# Altium schematic symbol library jlcpcb_2025_04_capacitors_extended_1206.schlib: 2503 symbols (part 13 of 14) (continued)
## TCC1206X7R104K251FTS
designator C?  Capacitance: 100nF  (hidden comment: *)
Capacitor, Ceramic (MLCC), 100nF, ±10%, 250V, X7R, ±10%, SMD 1206; Manufacturer: CCTC; Manufacturer Part Number: TCC1206X7R104K251FTS; Package Size: 1206; JLCPCB Basic Part: No; JLCPCB Part Number: C374076; Supplier 1: LCSC; Category: Capacitors - MLCC; Supplier Part Number 1: C374076; Tolerance: ±10%; Voltage Rating: 250V; Temperature Coefficient: X7R; RoHS: Yes; ComponentLink1Description: Datasheet; ComponentLink1URL: https://wmsc.lcsc.com/wmsc/upload/file/pdf/v2/lcsc/2304140030_CCTC-TCC1206X7R104K251FTS_C374076.pdf; ComponentLink2Description: JLCPCB Part URL; ComponentLink2URL: https://jlcpcb.com/partdetail/C374076; ComponentLink3Description: LCSC Part URL; ComponentLink3URL: https://lcsc.com/product-detail/Multilayer-Ceramic-Capacitors-MLCC---SMD-SMT_CCTC-CCTC-TCC1206X7R104K251FTS_C374076.html
footprint CAP-1206 (1206 (3216M) Capacitor)
pins: 1, 2

## TCC1206X7R104K251HT
designator C?  Capacitance: 100nF  (hidden comment: *)
Capacitor, Ceramic (MLCC), 100nF, ±10%, 250V, X7R, ±10%, SMD 1206; Manufacturer: CCTC; Manufacturer Part Number: TCC1206X7R104K251HT; Package Size: 1206; JLCPCB Basic Part: No; JLCPCB Part Number: C377065; Supplier 1: LCSC; Category: Capacitors - MLCC; Supplier Part Number 1: C377065; Tolerance: ±10%; Voltage Rating: 250V; Temperature Coefficient: X7R; RoHS: Yes; ComponentLink1Description: Datasheet; ComponentLink1URL: https://wmsc.lcsc.com/wmsc/upload/file/pdf/v2/lcsc/2304140030_CCTC-TCC1206X7R104K251HT_C377065.pdf; ComponentLink2Description: JLCPCB Part URL; ComponentLink2URL: https://jlcpcb.com/partdetail/C377065; ComponentLink3Description: LCSC Part URL; ComponentLink3URL: https://lcsc.com/product-detail/Multilayer-Ceramic-Capacitors-MLCC---SMD-SMT_CCTC-CCTC-TCC1206X7R104K251HT_C377065.html
footprint CAP-1206 (1206 (3216M) Capacitor)
pins: 1, 2

## TCC1206X7R104K451HT
designator C?  Capacitance: 100nF  (hidden comment: *)
Capacitor, Ceramic (MLCC), 100nF, ±10%, 450V, X7R, ±10%, SMD 1206; Manufacturer: CCTC; Manufacturer Part Number: TCC1206X7R104K451HT; Package Size: 1206; JLCPCB Basic Part: No; JLCPCB Part Number: C359183; Supplier 1: LCSC; Category: Capacitors - MLCC; Supplier Part Number 1: C359183; Tolerance: ±10%; Voltage Rating: 450V; Temperature Coefficient: X7R; RoHS: Yes; ComponentLink1Description: Datasheet; ComponentLink1URL: https://wmsc.lcsc.com/wmsc/upload/file/pdf/v2/lcsc/2312281452_CCTC-TCC1206X7R104K451HT_C359183.pdf; ComponentLink2Description: JLCPCB Part URL; ComponentLink2URL: https://jlcpcb.com/partdetail/C359183; ComponentLink3Description: LCSC Part URL; ComponentLink3URL: https://lcsc.com/product-detail/Multilayer-Ceramic-Capacitors-MLCC---SMD-SMT_CCTC-CCTC-TCC1206X7R104K451HT_C359183.html
footprint CAP-1206 (1206 (3216M) Capacitor)
pins: 1, 2

## TCC1206X7R104K500DT
designator C?  Capacitance: 100nF  (hidden comment: *)
Capacitor, Ceramic (MLCC), 100nF, ±10%, 50V, X7R, ±10%, SMD 1206; Manufacturer: CCTC; Manufacturer Part Number: TCC1206X7R104K500DT; Package Size: 1206; JLCPCB Basic Part: No; JLCPCB Part Number: C309030; Supplier 1: LCSC; Category: Capacitors - MLCC; Supplier Part Number 1: C309030; Tolerance: ±10%; Voltage Rating: 50V; Temperature Coefficient: X7R; RoHS: Yes; ComponentLink1Description: Datasheet; ComponentLink1URL: https://wmsc.lcsc.com/wmsc/upload/file/pdf/v2/lcsc/2304140030_CCTC-TCC1206X7R104K500DT_C309030.pdf; ComponentLink2Description: JLCPCB Part URL; ComponentLink2URL: https://jlcpcb.com/partdetail/C309030; ComponentLink3Description: LCSC Part URL; ComponentLink3URL: https://lcsc.com/product-detail/Multilayer-Ceramic-Capacitors-MLCC---SMD-SMT_CCTC-CCTC-TCC1206X7R104K500DT_C309030.html
footprint CAP-1206 (1206 (3216M) Capacitor)
pins: 1, 2

## TCC1206X7R104K500DTS
designator C?  Capacitance: 100nF  (hidden comment: *)
Capacitor, Ceramic (MLCC), 100nF, ±10%, 50V, X7R, ±10%, SMD 1206; Manufacturer: CCTC; Manufacturer Part Number: TCC1206X7R104K500DTS; Package Size: 1206; JLCPCB Basic Part: No; JLCPCB Part Number: C377066; Supplier 1: LCSC; Category: Capacitors - MLCC; Supplier Part Number 1: C377066; Tolerance: ±10%; Voltage Rating: 50V; Temperature Coefficient: X7R; RoHS: Yes; ComponentLink1Description: Datasheet; ComponentLink1URL: https://wmsc.lcsc.com/wmsc/upload/file/pdf/v2/lcsc/2304140030_CCTC-TCC1206X7R104K500DTS_C377066.pdf; ComponentLink2Description: JLCPCB Part URL; ComponentLink2URL: https://jlcpcb.com/partdetail/C377066; ComponentLink3Description: LCSC Part URL; ComponentLink3URL: https://lcsc.com/product-detail/Multilayer-Ceramic-Capacitors-MLCC---SMD-SMT_CCTC-CCTC-TCC1206X7R104K500DTS_C377066.html
footprint CAP-1206 (1206 (3216M) Capacitor)
pins: 1, 2

## TCC1206X7R104M251FT
designator C?  Capacitance: 100nF  (hidden comment: *)
Capacitor, Ceramic (MLCC), 100nF, ±20%, 250V, X7R, ±20%, SMD 1206; Manufacturer: CCTC; Manufacturer Part Number: TCC1206X7R104M251FT; Package Size: 1206; JLCPCB Basic Part: No; JLCPCB Part Number: C282822; Supplier 1: LCSC; Category: Capacitors - MLCC; Supplier Part Number 1: C282822; Tolerance: ±20%; Voltage Rating: 250V; Temperature Coefficient: X7R; RoHS: Yes; ComponentLink1Description: Datasheet; ComponentLink1URL: https://wmsc.lcsc.com/wmsc/upload/file/pdf/v2/lcsc/2304140030_CCTC-TCC1206X7R104M251FT_C282822.pdf; ComponentLink2Description: JLCPCB Part URL; ComponentLink2URL: https://jlcpcb.com/partdetail/C282822; ComponentLink3Description: LCSC Part URL; ComponentLink3URL: https://lcsc.com/product-detail/Multilayer-Ceramic-Capacitors-MLCC---SMD-SMT_CCTC-CCTC-TCC1206X7R104M251FT_C282822.html
footprint CAP-1206 (1206 (3216M) Capacitor)
pins: 1, 2

## TCC1206X7R104M500DT
designator C?  Capacitance: 100nF  (hidden comment: *)
Capacitor, Ceramic (MLCC), 100nF, ±20%, 50V, X7R, ±20%, SMD 1206; Manufacturer: CCTC; Manufacturer Part Number: TCC1206X7R104M500DT; Package Size: 1206; JLCPCB Basic Part: No; JLCPCB Part Number: C377067; Supplier 1: LCSC; Category: Capacitors - MLCC; Supplier Part Number 1: C377067; Tolerance: ±20%; Voltage Rating: 50V; Temperature Coefficient: X7R; RoHS: Yes; ComponentLink1Description: Datasheet; ComponentLink1URL: https://wmsc.lcsc.com/wmsc/upload/file/pdf/v2/lcsc/2304140030_CCTC-TCC1206X7R104M500DT_C377067.pdf; ComponentLink2Description: JLCPCB Part URL; ComponentLink2URL: https://jlcpcb.com/partdetail/C377067; ComponentLink3Description: LCSC Part URL; ComponentLink3URL: https://lcsc.com/product-detail/Multilayer-Ceramic-Capacitors-MLCC---SMD-SMT_CCTC-CCTC-TCC1206X7R104M500DT_C377067.html
footprint CAP-1206 (1206 (3216M) Capacitor)
pins: 1, 2

## TCC1206X7R104M501HT
designator C?  Capacitance: 100nF  (hidden comment: *)
Capacitor, Ceramic (MLCC), 100nF, ±20%, 500V, X7R, ±20%, SMD 1206; Manufacturer: CCTC; Manufacturer Part Number: TCC1206X7R104M501HT; Package Size: 1206; JLCPCB Basic Part: No; JLCPCB Part Number: C5448952; Supplier 1: LCSC; Category: Capacitors - MLCC; Supplier Part Number 1: C5448952; Tolerance: ±20%; Voltage Rating: 500V; Temperature Coefficient: X7R; RoHS: Yes; ComponentLink1Description: Datasheet; ComponentLink2Description: JLCPCB Part URL; ComponentLink2URL: https://jlcpcb.com/partdetail/C5448952; ComponentLink3Description: LCSC Part URL; ComponentLink3URL: https://lcsc.com/product-detail/Multilayer-Ceramic-Capacitors-MLCC---SMD-SMT_CCTC-CCTC-TCC1206X7R104M501HT_C5448952.html
footprint CAP-1206 (1206 (3216M) Capacitor)
pins: 1, 2

## TCC1206X7R105K101HT
designator C?  Capacitance: 1uF  (hidden comment: *)
Capacitor, Ceramic (MLCC), 1uF, ±10%, 100V, X7R, ±10%, SMD 1206; Manufacturer: CCTC; Manufacturer Part Number: TCC1206X7R105K101HT; Package Size: 1206; JLCPCB Basic Part: No; JLCPCB Part Number: C282823; Supplier 1: LCSC; Category: Capacitors - MLCC; Supplier Part Number 1: C282823; Tolerance: ±10%; Voltage Rating: 100V; Temperature Coefficient: X7R; RoHS: Yes; ComponentLink1Description: Datasheet; ComponentLink1URL: https://wmsc.lcsc.com/wmsc/upload/file/pdf/v2/lcsc/2211221000_CCTC-TCC1206X7R105K101HT_C282823.pdf; ComponentLink2Description: JLCPCB Part URL; ComponentLink2URL: https://jlcpcb.com/partdetail/C282823; ComponentLink3Description: LCSC Part URL; ComponentLink3URL: https://lcsc.com/product-detail/Multilayer-Ceramic-Capacitors-MLCC---SMD-SMT_CCTC-CCTC-TCC1206X7R105K101HT_C282823.html
footprint CAP-1206 (1206 (3216M) Capacitor)
pins: 1, 2

## TCC1206X7R105K500HT
designator C?  Capacitance: 1uF  (hidden comment: *)
Capacitor, Ceramic (MLCC), 1uF, ±10%, 50V, X7R, ±10%, SMD 1206; Manufacturer: CCTC; Manufacturer Part Number: TCC1206X7R105K500HT; Package Size: 1206; JLCPCB Basic Part: No; JLCPCB Part Number: C282824; Supplier 1: LCSC; Category: Capacitors - MLCC; Supplier Part Number 1: C282824; Tolerance: ±10%; Voltage Rating: 50V; Temperature Coefficient: X7R; RoHS: Yes; ComponentLink1Description: Datasheet; ComponentLink1URL: https://wmsc.lcsc.com/wmsc/upload/file/pdf/v2/lcsc/2304140030_CCTC-TCC1206X7R105K500HT_C282824.pdf; ComponentLink2Description: JLCPCB Part URL; ComponentLink2URL: https://jlcpcb.com/partdetail/C282824; ComponentLink3Description: LCSC Part URL; ComponentLink3URL: https://lcsc.com/product-detail/Multilayer-Ceramic-Capacitors-MLCC---SMD-SMT_CCTC-CCTC-TCC1206X7R105K500HT_C282824.html
footprint CAP-1206 (1206 (3216M) Capacitor)
pins: 1, 2

## TCC1206X7R105M101HT
designator C?  Capacitance: 1uF  (hidden comment: *)
Capacitor, Ceramic (MLCC), 1uF, ±20%, 100V, X7R, ±20%, SMD 1206; Manufacturer: CCTC; Manufacturer Part Number: TCC1206X7R105M101HT; Package Size: 1206; JLCPCB Basic Part: No; JLCPCB Part Number: C282825; Supplier 1: LCSC; Category: Capacitors - MLCC; Supplier Part Number 1: C282825; Tolerance: ±20%; Voltage Rating: 100V; Temperature Coefficient: X7R; RoHS: Yes; ComponentLink1Description: Datasheet; ComponentLink1URL: https://wmsc.lcsc.com/wmsc/upload/file/pdf/v2/lcsc/2304140030_CCTC-TCC1206X7R105M101HT_C282825.pdf; ComponentLink2Description: JLCPCB Part URL; ComponentLink2URL: https://jlcpcb.com/partdetail/C282825; ComponentLink3Description: LCSC Part URL; ComponentLink3URL: https://lcsc.com/product-detail/Multilayer-Ceramic-Capacitors-MLCC---SMD-SMT_CCTC-CCTC-TCC1206X7R105M101HT_C282825.html
footprint CAP-1206 (1206 (3216M) Capacitor)
pins: 1, 2

## TCC1206X7R105M500HT
designator C?  Capacitance: 1uF  (hidden comment: *)
Capacitor, Ceramic (MLCC), 1uF, ±20%, 50V, X7R, ±20%, SMD 1206; Manufacturer: CCTC; Manufacturer Part Number: TCC1206X7R105M500HT; Package Size: 1206; JLCPCB Basic Part: No; JLCPCB Part Number: C377070; Supplier 1: LCSC; Category: Capacitors - MLCC; Supplier Part Number 1: C377070; Tolerance: ±20%; Voltage Rating: 50V; Temperature Coefficient: X7R; RoHS: Yes; ComponentLink1Description: Datasheet; ComponentLink1URL: https://wmsc.lcsc.com/wmsc/upload/file/pdf/v2/lcsc/2304140030_CCTC-TCC1206X7R105M500HT_C377070.pdf; ComponentLink2Description: JLCPCB Part URL; ComponentLink2URL: https://jlcpcb.com/partdetail/C377070; ComponentLink3Description: LCSC Part URL; ComponentLink3URL: https://lcsc.com/product-detail/Multilayer-Ceramic-Capacitors-MLCC---SMD-SMT_CCTC-CCTC-TCC1206X7R105M500HT_C377070.html
footprint CAP-1206 (1206 (3216M) Capacitor)
pins: 1, 2

## TCC1206X7R106K100HT
designator C?  Capacitance: 10uF  (hidden comment: *)
Capacitor, Ceramic (MLCC), 10uF, ±10%, 10V, X7R, ±10%, SMD 1206; Manufacturer: CCTC; Manufacturer Part Number: TCC1206X7R106K100HT; Package Size: 1206; JLCPCB Basic Part: No; JLCPCB Part Number: C380362; Supplier 1: LCSC; Category: Capacitors - MLCC; Supplier Part Number 1: C380362; Tolerance: ±10%; Voltage Rating: 10V; Temperature Coefficient: X7R; RoHS: Yes; ComponentLink1Description: Datasheet; ComponentLink1URL: https://wmsc.lcsc.com/wmsc/upload/file/pdf/v2/lcsc/2304140030_CCTC-TCC1206X7R106K100HT_C380362.pdf; ComponentLink2Description: JLCPCB Part URL; ComponentLink2URL: https://jlcpcb.com/partdetail/C380362; ComponentLink3Description: LCSC Part URL; ComponentLink3URL: https://lcsc.com/product-detail/Multilayer-Ceramic-Capacitors-MLCC---SMD-SMT_CCTC-CCTC-TCC1206X7R106K100HT_C380362.html
footprint CAP-1206 (1206 (3216M) Capacitor)
pins: 1, 2

## TCC1206X7R106K160HT
designator C?  Capacitance: 10uF  (hidden comment: *)
Capacitor, Ceramic (MLCC), 10uF, ±10%, 16V, X7R, ±10%, SMD 1206; Manufacturer: CCTC; Manufacturer Part Number: TCC1206X7R106K160HT; Package Size: 1206; JLCPCB Basic Part: No; JLCPCB Part Number: C380363; Supplier 1: LCSC; Category: Capacitors - MLCC; Supplier Part Number 1: C380363; Tolerance: ±10%; Voltage Rating: 16V; Temperature Coefficient: X7R; RoHS: Yes; ComponentLink1Description: Datasheet; ComponentLink1URL: https://wmsc.lcsc.com/wmsc/upload/file/pdf/v2/lcsc/2304140030_CCTC-TCC1206X7R106K160HT_C380363.pdf; ComponentLink2Description: JLCPCB Part URL; ComponentLink2URL: https://jlcpcb.com/partdetail/C380363; ComponentLink3Description: LCSC Part URL; ComponentLink3URL: https://lcsc.com/product-detail/Multilayer-Ceramic-Capacitors-MLCC---SMD-SMT_CCTC-CCTC-TCC1206X7R106K160HT_C380363.html
footprint CAP-1206 (1206 (3216M) Capacitor)
pins: 1, 2

## TCC1206X7R106K250HT
designator C?  Capacitance: 10uF  (hidden comment: *)
Capacitor, Ceramic (MLCC), 10uF, ±10%, 25V, X7R, ±10%, SMD 1206; Manufacturer: CCTC; Manufacturer Part Number: TCC1206X7R106K250HT; Package Size: 1206; JLCPCB Basic Part: No; JLCPCB Part Number: C380364; Supplier 1: LCSC; Category: Capacitors - MLCC; Supplier Part Number 1: C380364; Tolerance: ±10%; Voltage Rating: 25V; Temperature Coefficient: X7R; RoHS: Yes; ComponentLink1Description: Datasheet; ComponentLink1URL: https://wmsc.lcsc.com/wmsc/upload/file/pdf/v2/lcsc/2304140030_CCTC-TCC1206X7R106K250HT_C380364.pdf; ComponentLink2Description: JLCPCB Part URL; ComponentLink2URL: https://jlcpcb.com/partdetail/C380364; ComponentLink3Description: LCSC Part URL; ComponentLink3URL: https://lcsc.com/product-detail/Multilayer-Ceramic-Capacitors-MLCC---SMD-SMT_CCTC-CCTC-TCC1206X7R106K250HT_C380364.html
footprint CAP-1206 (1206 (3216M) Capacitor)
pins: 1, 2

## TCC1206X7R121K102ET
designator C?  Capacitance: 120pF  (hidden comment: *)
Capacitor, Ceramic (MLCC), 120pF, ±10%, 1kV, X7R, ±10%, SMD 1206; Manufacturer: CCTC; Manufacturer Part Number: TCC1206X7R121K102ET; Package Size: 1206; JLCPCB Basic Part: No; JLCPCB Part Number: C282826; Supplier 1: LCSC; Category: Capacitors - MLCC; Supplier Part Number 1: C282826; Tolerance: ±10%; Voltage Rating: 1kV; Temperature Coefficient: X7R; RoHS: Yes; ComponentLink1Description: Datasheet; ComponentLink1URL: https://wmsc.lcsc.com/wmsc/upload/file/pdf/v2/lcsc/2304140030_CCTC-TCC1206X7R121K102ET_C282826.pdf; ComponentLink2Description: JLCPCB Part URL; ComponentLink2URL: https://jlcpcb.com/partdetail/C282826; ComponentLink3Description: LCSC Part URL; ComponentLink3URL: https://lcsc.com/product-detail/Multilayer-Ceramic-Capacitors-MLCC---SMD-SMT_CCTC-CCTC-TCC1206X7R121K102ET_C282826.html
footprint CAP-1206 (1206 (3216M) Capacitor)
pins: 1, 2

## TCC1206X7R122K102FT
designator C?  Capacitance: 1.2nF  (hidden comment: *)
Capacitor, Ceramic (MLCC), 1.2nF, ±10%, 1kV, X7R, ±10%, SMD 1206; Manufacturer: CCTC; Manufacturer Part Number: TCC1206X7R122K102FT; Package Size: 1206; JLCPCB Basic Part: No; JLCPCB Part Number: C282827; Supplier 1: LCSC; Category: Capacitors - MLCC; Supplier Part Number 1: C282827; Tolerance: ±10%; Voltage Rating: 1kV; Temperature Coefficient: X7R; RoHS: Yes; ComponentLink1Description: Datasheet; ComponentLink1URL: https://wmsc.lcsc.com/wmsc/upload/file/pdf/v2/lcsc/2304140030_CCTC-TCC1206X7R122K102FT_C282827.pdf; ComponentLink2Description: JLCPCB Part URL; ComponentLink2URL: https://jlcpcb.com/partdetail/C282827; ComponentLink3Description: LCSC Part URL; ComponentLink3URL: https://lcsc.com/product-detail/Multilayer-Ceramic-Capacitors-MLCC---SMD-SMT_CCTC-CCTC-TCC1206X7R122K102FT_C282827.html
footprint CAP-1206 (1206 (3216M) Capacitor)
pins: 1, 2

## TCC1206X7R123K102FT
designator C?  Capacitance: 12nF  (hidden comment: *)
Capacitor, Ceramic (MLCC), 12nF, ±10%, 1kV, X7R, ±10%, SMD 1206; Manufacturer: CCTC; Manufacturer Part Number: TCC1206X7R123K102FT; Package Size: 1206; JLCPCB Basic Part: No; JLCPCB Part Number: C7393987; Supplier 1: LCSC; Category: Capacitors - MLCC; Supplier Part Number 1: C7393987; Tolerance: ±10%; Voltage Rating: 1kV; Temperature Coefficient: X7R; RoHS: Yes; ComponentLink1Description: Datasheet; ComponentLink1URL: https://wmsc.lcsc.com/wmsc/upload/file/pdf/v2/lcsc/2306211528_CCTC-TCC1206X7R123K102FT_C7393987.pdf; ComponentLink2Description: JLCPCB Part URL; ComponentLink2URL: https://jlcpcb.com/partdetail/C7393987; ComponentLink3Description: LCSC Part URL; ComponentLink3URL: https://lcsc.com/product-detail/Multilayer-Ceramic-Capacitors-MLCC---SMD-SMT_CCTC-CCTC-TCC1206X7R123K102FT_C7393987.html
footprint CAP-1206 (1206 (3216M) Capacitor)
pins: 1, 2

## TCC1206X7R151K102DTS
designator C?  Capacitance: 150pF  (hidden comment: *)
Capacitor, Ceramic (MLCC), 150pF, ±10%, 1kV, X7R, ±10%, SMD 1206; Manufacturer: CCTC; Manufacturer Part Number: TCC1206X7R151K102DTS; Package Size: 1206; JLCPCB Basic Part: No; JLCPCB Part Number: C377072; Supplier 1: LCSC; Category: Capacitors - MLCC; Supplier Part Number 1: C377072; Tolerance: ±10%; Voltage Rating: 1kV; Temperature Coefficient: X7R; RoHS: Yes; ComponentLink1Description: Datasheet; ComponentLink1URL: https://wmsc.lcsc.com/wmsc/upload/file/pdf/v2/lcsc/2304140030_CCTC-TCC1206X7R151K102DTS_C377072.pdf; ComponentLink2Description: JLCPCB Part URL; ComponentLink2URL: https://jlcpcb.com/partdetail/C377072; ComponentLink3Description: LCSC Part URL; ComponentLink3URL: https://lcsc.com/product-detail/Multilayer-Ceramic-Capacitors-MLCC---SMD-SMT_CCTC-CCTC-TCC1206X7R151K102DTS_C377072.html
footprint CAP-1206 (1206 (3216M) Capacitor)
pins: 1, 2

## TCC1206X7R151K102FT
designator C?  Capacitance: 150pF  (hidden comment: *)
Capacitor, Ceramic (MLCC), 150pF, ±10%, 1kV, X7R, ±10%, SMD 1206; Manufacturer: CCTC; Manufacturer Part Number: TCC1206X7R151K102FT; Package Size: 1206; JLCPCB Basic Part: No; JLCPCB Part Number: C282829; Supplier 1: LCSC; Category: Capacitors - MLCC; Supplier Part Number 1: C282829; Tolerance: ±10%; Voltage Rating: 1kV; Temperature Coefficient: X7R; RoHS: Yes; ComponentLink1Description: Datasheet; ComponentLink1URL: https://wmsc.lcsc.com/wmsc/upload/file/pdf/v2/lcsc/2304140030_CCTC-TCC1206X7R151K102FT_C282829.pdf; ComponentLink2Description: JLCPCB Part URL; ComponentLink2URL: https://jlcpcb.com/partdetail/C282829; ComponentLink3Description: LCSC Part URL; ComponentLink3URL: https://lcsc.com/product-detail/Multilayer-Ceramic-Capacitors-MLCC---SMD-SMT_CCTC-CCTC-TCC1206X7R151K102FT_C282829.html
footprint CAP-1206 (1206 (3216M) Capacitor)
pins: 1, 2

## TCC1206X7R151K251DT
designator C?  Capacitance: 150pF  (hidden comment: *)
Capacitor, Ceramic (MLCC), 150pF, ±10%, 250V, X7R, ±10%, SMD 1206; Manufacturer: CCTC; Manufacturer Part Number: TCC1206X7R151K251DT; Package Size: 1206; JLCPCB Basic Part: No; JLCPCB Part Number: C282830; Supplier 1: LCSC; Category: Capacitors - MLCC; Supplier Part Number 1: C282830; Tolerance: ±10%; Voltage Rating: 250V; Temperature Coefficient: X7R; RoHS: Yes; ComponentLink1Description: Datasheet; ComponentLink1URL: https://wmsc.lcsc.com/wmsc/upload/file/pdf/v2/lcsc/2304140030_CCTC-TCC1206X7R151K251DT_C282830.pdf; ComponentLink2Description: JLCPCB Part URL; ComponentLink2URL: https://jlcpcb.com/partdetail/C282830; ComponentLink3Description: LCSC Part URL; ComponentLink3URL: https://lcsc.com/product-detail/Multilayer-Ceramic-Capacitors-MLCC---SMD-SMT_CCTC-CCTC-TCC1206X7R151K251DT_C282830.html
footprint CAP-1206 (1206 (3216M) Capacitor)
pins: 1, 2

## TCC1206X7R151K500DT
designator C?  Capacitance: 150pF  (hidden comment: *)
Capacitor, Ceramic (MLCC), 150pF, ±10%, 50V, X7R, ±10%, SMD 1206; Manufacturer: CCTC; Manufacturer Part Number: TCC1206X7R151K500DT; Package Size: 1206; JLCPCB Basic Part: No; JLCPCB Part Number: C282831; Supplier 1: LCSC; Category: Capacitors - MLCC; Supplier Part Number 1: C282831; Tolerance: ±10%; Voltage Rating: 50V; Temperature Coefficient: X7R; RoHS: Yes; ComponentLink1Description: Datasheet; ComponentLink1URL: https://wmsc.lcsc.com/wmsc/upload/file/pdf/v2/lcsc/2304140030_CCTC-TCC1206X7R151K500DT_C282831.pdf; ComponentLink2Description: JLCPCB Part URL; ComponentLink2URL: https://jlcpcb.com/partdetail/C282831; ComponentLink3Description: LCSC Part URL; ComponentLink3URL: https://lcsc.com/product-detail/Multilayer-Ceramic-Capacitors-MLCC---SMD-SMT_CCTC-CCTC-TCC1206X7R151K500DT_C282831.html
footprint CAP-1206 (1206 (3216M) Capacitor)
pins: 1, 2

## TCC1206X7R151K501DT
designator C?  Capacitance: 150pF  (hidden comment: *)
Capacitor, Ceramic (MLCC), 150pF, ±10%, 500V, X7R, ±10%, SMD 1206; Manufacturer: CCTC; Manufacturer Part Number: TCC1206X7R151K501DT; Package Size: 1206; JLCPCB Basic Part: No; JLCPCB Part Number: C282832; Supplier 1: LCSC; Category: Capacitors - MLCC; Supplier Part Number 1: C282832; Tolerance: ±10%; Voltage Rating: 500V; Temperature Coefficient: X7R; RoHS: Yes; ComponentLink1Description: Datasheet; ComponentLink1URL: https://wmsc.lcsc.com/wmsc/upload/file/pdf/v2/lcsc/2304140030_CCTC-TCC1206X7R151K501DT_C282832.pdf; ComponentLink2Description: JLCPCB Part URL; ComponentLink2URL: https://jlcpcb.com/partdetail/C282832; ComponentLink3Description: LCSC Part URL; ComponentLink3URL: https://lcsc.com/product-detail/Multilayer-Ceramic-Capacitors-MLCC---SMD-SMT_CCTC-CCTC-TCC1206X7R151K501DT_C282832.html
footprint CAP-1206 (1206 (3216M) Capacitor)
pins: 1, 2

## TCC1206X7R152K101DT
designator C?  Capacitance: 1.5nF  (hidden comment: *)
Capacitor, Ceramic (MLCC), 1.5nF, ±10%, 100V, X7R, ±10%, SMD 1206; Manufacturer: CCTC; Manufacturer Part Number: TCC1206X7R152K101DT; Package Size: 1206; JLCPCB Basic Part: No; JLCPCB Part Number: C282833; Supplier 1: LCSC; Category: Capacitors - MLCC; Supplier Part Number 1: C282833; Tolerance: ±10%; Voltage Rating: 100V; Temperature Coefficient: X7R; RoHS: Yes; ComponentLink1Description: Datasheet; ComponentLink1URL: https://wmsc.lcsc.com/wmsc/upload/file/pdf/v2/lcsc/2304140030_CCTC-TCC1206X7R152K101DT_C282833.pdf; ComponentLink2Description: JLCPCB Part URL; ComponentLink2URL: https://jlcpcb.com/partdetail/C282833; ComponentLink3Description: LCSC Part URL; ComponentLink3URL: https://lcsc.com/product-detail/Multilayer-Ceramic-Capacitors-MLCC---SMD-SMT_CCTC-CCTC-TCC1206X7R152K101DT_C282833.html
footprint CAP-1206 (1206 (3216M) Capacitor)
pins: 1, 2

## TCC1206X7R152K102DTS
designator C?  Capacitance: 1.5nF  (hidden comment: *)
Capacitor, Ceramic (MLCC), 1.5nF, ±10%, 1kV, X7R, ±10%, SMD 1206; Manufacturer: CCTC; Manufacturer Part Number: TCC1206X7R152K102DTS; Package Size: 1206; JLCPCB Basic Part: No; JLCPCB Part Number: C282834; Supplier 1: LCSC; Category: Capacitors - MLCC; Supplier Part Number 1: C282834; Tolerance: ±10%; Voltage Rating: 1kV; Temperature Coefficient: X7R; RoHS: Yes; ComponentLink1Description: Datasheet; ComponentLink1URL: https://wmsc.lcsc.com/wmsc/upload/file/pdf/v2/lcsc/2304140030_CCTC-TCC1206X7R152K102DTS_C282834.pdf; ComponentLink2Description: JLCPCB Part URL; ComponentLink2URL: https://jlcpcb.com/partdetail/C282834; ComponentLink3Description: LCSC Part URL; ComponentLink3URL: https://lcsc.com/product-detail/Multilayer-Ceramic-Capacitors-MLCC---SMD-SMT_CCTC-CCTC-TCC1206X7R152K102DTS_C282834.html
footprint CAP-1206 (1206 (3216M) Capacitor)
pins: 1, 2

## TCC1206X7R152K102FT
designator C?  Capacitance: 1.5nF  (hidden comment: *)
Capacitor, Ceramic (MLCC), 1.5nF, ±10%, 1kV, X7R, ±10%, SMD 1206; Manufacturer: CCTC; Manufacturer Part Number: TCC1206X7R152K102FT; Package Size: 1206; JLCPCB Basic Part: No; JLCPCB Part Number: C282835; Supplier 1: LCSC; Category: Capacitors - MLCC; Supplier Part Number 1: C282835; Tolerance: ±10%; Voltage Rating: 1kV; Temperature Coefficient: X7R; RoHS: Yes; ComponentLink1Description: Datasheet; ComponentLink1URL: https://wmsc.lcsc.com/wmsc/upload/file/pdf/v2/lcsc/2304140030_CCTC-TCC1206X7R152K102FT_C282835.pdf; ComponentLink2Description: JLCPCB Part URL; ComponentLink2URL: https://jlcpcb.com/partdetail/C282835; ComponentLink3Description: LCSC Part URL; ComponentLink3URL: https://lcsc.com/product-detail/Multilayer-Ceramic-Capacitors-MLCC---SMD-SMT_CCTC-CCTC-TCC1206X7R152K102FT_C282835.html
footprint CAP-1206 (1206 (3216M) Capacitor)
pins: 1, 2

## TCC1206X7R152K251DT
designator C?  Capacitance: 1.5nF  (hidden comment: *)
Capacitor, Ceramic (MLCC), 1.5nF, ±10%, 250V, X7R, ±10%, SMD 1206; Manufacturer: CCTC; Manufacturer Part Number: TCC1206X7R152K251DT; Package Size: 1206; JLCPCB Basic Part: No; JLCPCB Part Number: C282836; Supplier 1: LCSC; Category: Capacitors - MLCC; Supplier Part Number 1: C282836; Tolerance: ±10%; Voltage Rating: 250V; Temperature Coefficient: X7R; RoHS: Yes; ComponentLink1Description: Datasheet; ComponentLink1URL: https://wmsc.lcsc.com/wmsc/upload/file/pdf/v2/lcsc/2304140030_CCTC-TCC1206X7R152K251DT_C282836.pdf; ComponentLink2Description: JLCPCB Part URL; ComponentLink2URL: https://jlcpcb.com/partdetail/C282836; ComponentLink3Description: LCSC Part URL; ComponentLink3URL: https://lcsc.com/product-detail/Multilayer-Ceramic-Capacitors-MLCC---SMD-SMT_CCTC-CCTC-TCC1206X7R152K251DT_C282836.html
footprint CAP-1206 (1206 (3216M) Capacitor)
pins: 1, 2

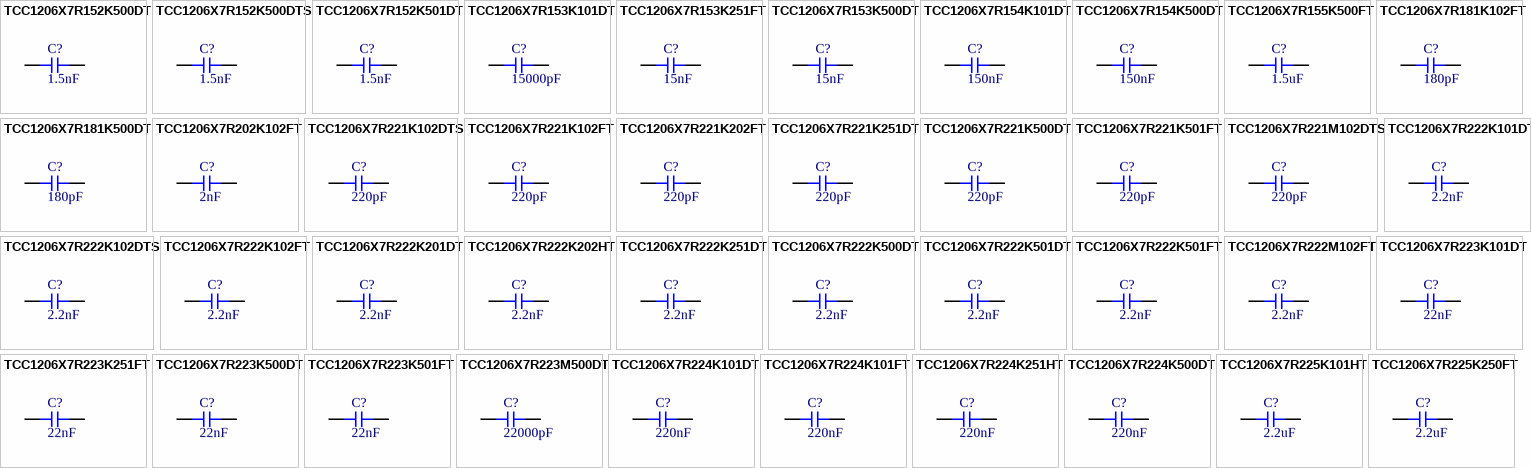
[diagram p59: symbols TCC1206X7R152K500DT to TCC1206X7R225K250FT]

## TCC1206X7R152K500DT
designator C?  Capacitance: 1.5nF  (hidden comment: *)
Capacitor, Ceramic (MLCC), 1.5nF, ±10%, 50V, X7R, ±10%, SMD 1206; Manufacturer: CCTC; Manufacturer Part Number: TCC1206X7R152K500DT; Package Size: 1206; JLCPCB Basic Part: No; JLCPCB Part Number: C282837; Supplier 1: LCSC; Category: Capacitors - MLCC; Supplier Part Number 1: C282837; Tolerance: ±10%; Voltage Rating: 50V; Temperature Coefficient: X7R; RoHS: Yes; ComponentLink1Description: Datasheet; ComponentLink1URL: https://wmsc.lcsc.com/wmsc/upload/file/pdf/v2/lcsc/2304140030_CCTC-TCC1206X7R152K500DT_C282837.pdf; ComponentLink2Description: JLCPCB Part URL; ComponentLink2URL: https://jlcpcb.com/partdetail/C282837; ComponentLink3Description: LCSC Part URL; ComponentLink3URL: https://lcsc.com/product-detail/Multilayer-Ceramic-Capacitors-MLCC---SMD-SMT_CCTC-CCTC-TCC1206X7R152K500DT_C282837.html
footprint CAP-1206 (1206 (3216M) Capacitor)
pins: 1, 2

## TCC1206X7R152K500DTS
designator C?  Capacitance: 1.5nF  (hidden comment: *)
Capacitor, Ceramic (MLCC), 1.5nF, ±10%, 50V, X7R, ±10%, SMD 1206; Manufacturer: CCTC; Manufacturer Part Number: TCC1206X7R152K500DTS; Package Size: 1206; JLCPCB Basic Part: No; JLCPCB Part Number: C282838; Supplier 1: LCSC; Category: Capacitors - MLCC; Supplier Part Number 1: C282838; Tolerance: ±10%; Voltage Rating: 50V; Temperature Coefficient: X7R; RoHS: Yes; ComponentLink1Description: Datasheet; ComponentLink1URL: https://wmsc.lcsc.com/wmsc/upload/file/pdf/v2/lcsc/2304140030_CCTC-TCC1206X7R152K500DTS_C282838.pdf; ComponentLink2Description: JLCPCB Part URL; ComponentLink2URL: https://jlcpcb.com/partdetail/C282838; ComponentLink3Description: LCSC Part URL; ComponentLink3URL: https://lcsc.com/product-detail/Multilayer-Ceramic-Capacitors-MLCC---SMD-SMT_CCTC-CCTC-TCC1206X7R152K500DTS_C282838.html
footprint CAP-1206 (1206 (3216M) Capacitor)
pins: 1, 2

## TCC1206X7R152K501DT
designator C?  Capacitance: 1.5nF  (hidden comment: *)
Capacitor, Ceramic (MLCC), 1.5nF, ±10%, 500V, X7R, ±10%, SMD 1206; Manufacturer: CCTC; Manufacturer Part Number: TCC1206X7R152K501DT; Package Size: 1206; JLCPCB Basic Part: No; JLCPCB Part Number: C282839; Supplier 1: LCSC; Category: Capacitors - MLCC; Supplier Part Number 1: C282839; Tolerance: ±10%; Voltage Rating: 500V; Temperature Coefficient: X7R; RoHS: Yes; ComponentLink1Description: Datasheet; ComponentLink1URL: https://wmsc.lcsc.com/wmsc/upload/file/pdf/v2/lcsc/2304140030_CCTC-TCC1206X7R152K501DT_C282839.pdf; ComponentLink2Description: JLCPCB Part URL; ComponentLink2URL: https://jlcpcb.com/partdetail/C282839; ComponentLink3Description: LCSC Part URL; ComponentLink3URL: https://lcsc.com/product-detail/Multilayer-Ceramic-Capacitors-MLCC---SMD-SMT_CCTC-CCTC-TCC1206X7R152K501DT_C282839.html
footprint CAP-1206 (1206 (3216M) Capacitor)
pins: 1, 2

## TCC1206X7R153K101DT
designator C?  Capacitance: 15000pF  (hidden comment: *)
Capacitor, Ceramic (MLCC), 15000pF, ±10%, 100V, X7R, ±10%, SMD 1206; Manufacturer: CCTC; Manufacturer Part Number: TCC1206X7R153K101DT; Package Size: 1206; JLCPCB Basic Part: No; JLCPCB Part Number: C880619; Supplier 1: LCSC; Category: Capacitors - MLCC; Supplier Part Number 1: C880619; Tolerance: ±10%; Voltage Rating: 100V; Temperature Coefficient: X7R; RoHS: Yes; ComponentLink1Description: Datasheet; ComponentLink1URL: https://wmsc.lcsc.com/wmsc/upload/file/pdf/v2/lcsc/2304140030_CCTC-TCC1206X7R153K101DT_C880619.pdf; ComponentLink2Description: JLCPCB Part URL; ComponentLink2URL: https://jlcpcb.com/partdetail/C880619; ComponentLink3Description: LCSC Part URL; ComponentLink3URL: https://lcsc.com/product-detail/Multilayer-Ceramic-Capacitors-MLCC---SMD-SMT_CCTC-CCTC-TCC1206X7R153K101DT_C880619.html
footprint CAP-1206 (1206 (3216M) Capacitor)
pins: 1, 2

## TCC1206X7R153K251FT
designator C?  Capacitance: 15nF  (hidden comment: *)
Capacitor, Ceramic (MLCC), 15nF, ±10%, 250V, X7R, ±10%, SMD 1206; Manufacturer: CCTC; Manufacturer Part Number: TCC1206X7R153K251FT; Package Size: 1206; JLCPCB Basic Part: No; JLCPCB Part Number: C282840; Supplier 1: LCSC; Category: Capacitors - MLCC; Supplier Part Number 1: C282840; Tolerance: ±10%; Voltage Rating: 250V; Temperature Coefficient: X7R; RoHS: Yes; ComponentLink1Description: Datasheet; ComponentLink1URL: https://wmsc.lcsc.com/wmsc/upload/file/pdf/v2/lcsc/2304140030_CCTC-TCC1206X7R153K251FT_C282840.pdf; ComponentLink2Description: JLCPCB Part URL; ComponentLink2URL: https://jlcpcb.com/partdetail/C282840; ComponentLink3Description: LCSC Part URL; ComponentLink3URL: https://lcsc.com/product-detail/Multilayer-Ceramic-Capacitors-MLCC---SMD-SMT_CCTC-CCTC-TCC1206X7R153K251FT_C282840.html
footprint CAP-1206 (1206 (3216M) Capacitor)
pins: 1, 2

## TCC1206X7R153K500DT
designator C?  Capacitance: 15nF  (hidden comment: *)
Capacitor, Ceramic (MLCC), 15nF, ±10%, 50V, X7R, ±10%, SMD 1206; Manufacturer: CCTC; Manufacturer Part Number: TCC1206X7R153K500DT; Package Size: 1206; JLCPCB Basic Part: No; JLCPCB Part Number: C282841; Supplier 1: LCSC; Category: Capacitors - MLCC; Supplier Part Number 1: C282841; Tolerance: ±10%; Voltage Rating: 50V; Temperature Coefficient: X7R; RoHS: Yes; ComponentLink1Description: Datasheet; ComponentLink1URL: https://wmsc.lcsc.com/wmsc/upload/file/pdf/v2/lcsc/2304140030_CCTC-TCC1206X7R153K500DT_C282841.pdf; ComponentLink2Description: JLCPCB Part URL; ComponentLink2URL: https://jlcpcb.com/partdetail/C282841; ComponentLink3Description: LCSC Part URL; ComponentLink3URL: https://lcsc.com/product-detail/Multilayer-Ceramic-Capacitors-MLCC---SMD-SMT_CCTC-CCTC-TCC1206X7R153K500DT_C282841.html
footprint CAP-1206 (1206 (3216M) Capacitor)
pins: 1, 2

## TCC1206X7R154K101DT
designator C?  Capacitance: 150nF  (hidden comment: *)
Capacitor, Ceramic (MLCC), 150nF, ±10%, 100V, X7R, ±10%, SMD 1206; Manufacturer: CCTC; Manufacturer Part Number: TCC1206X7R154K101DT; Package Size: 1206; JLCPCB Basic Part: No; JLCPCB Part Number: C5449004; Supplier 1: LCSC; Category: Capacitors - MLCC; Supplier Part Number 1: C5449004; Tolerance: ±10%; Voltage Rating: 100V; Temperature Coefficient: X7R; RoHS: Yes; ComponentLink1Description: Datasheet; ComponentLink1URL: https://wmsc.lcsc.com/wmsc/upload/file/pdf/v2/lcsc/2403281713_CCTC-TCC1206X7R154K101DT_C5449004.pdf; ComponentLink2Description: JLCPCB Part URL; ComponentLink2URL: https://jlcpcb.com/partdetail/C5449004; ComponentLink3Description: LCSC Part URL; ComponentLink3URL: https://lcsc.com/product-detail/Multilayer-Ceramic-Capacitors-MLCC---SMD-SMT_CCTC-CCTC-TCC1206X7R154K101DT_C5449004.html
footprint CAP-1206 (1206 (3216M) Capacitor)
pins: 1, 2

## TCC1206X7R154K500DT
designator C?  Capacitance: 150nF  (hidden comment: *)
Capacitor, Ceramic (MLCC), 150nF, ±10%, 50V, X7R, ±10%, SMD 1206; Manufacturer: CCTC; Manufacturer Part Number: TCC1206X7R154K500DT; Package Size: 1206; JLCPCB Basic Part: No; JLCPCB Part Number: C282843; Supplier 1: LCSC; Category: Capacitors - MLCC; Supplier Part Number 1: C282843; Tolerance: ±10%; Voltage Rating: 50V; Temperature Coefficient: X7R; RoHS: Yes; ComponentLink1Description: Datasheet; ComponentLink1URL: https://wmsc.lcsc.com/wmsc/upload/file/pdf/v2/lcsc/2304140030_CCTC-TCC1206X7R154K500DT_C282843.pdf; ComponentLink2Description: JLCPCB Part URL; ComponentLink2URL: https://jlcpcb.com/partdetail/C282843; ComponentLink3Description: LCSC Part URL; ComponentLink3URL: https://lcsc.com/product-detail/Multilayer-Ceramic-Capacitors-MLCC---SMD-SMT_CCTC-CCTC-TCC1206X7R154K500DT_C282843.html
footprint CAP-1206 (1206 (3216M) Capacitor)
pins: 1, 2

## TCC1206X7R155K500FT
designator C?  Capacitance: 1.5uF  (hidden comment: *)
Capacitor, Ceramic (MLCC), 1.5uF, ±10%, 50V, X7R, ±10%, SMD 1206; Manufacturer: CCTC; Manufacturer Part Number: TCC1206X7R155K500FT; Package Size: 1206; JLCPCB Basic Part: No; JLCPCB Part Number: C282844; Supplier 1: LCSC; Category: Capacitors - MLCC; Supplier Part Number 1: C282844; Tolerance: ±10%; Voltage Rating: 50V; Temperature Coefficient: X7R; RoHS: Yes; ComponentLink1Description: Datasheet; ComponentLink1URL: https://wmsc.lcsc.com/wmsc/upload/file/pdf/v2/lcsc/2304140030_CCTC-TCC1206X7R155K500FT_C282844.pdf; ComponentLink2Description: JLCPCB Part URL; ComponentLink2URL: https://jlcpcb.com/partdetail/C282844; ComponentLink3Description: LCSC Part URL; ComponentLink3URL: https://lcsc.com/product-detail/Multilayer-Ceramic-Capacitors-MLCC---SMD-SMT_CCTC-CCTC-TCC1206X7R155K500FT_C282844.html
footprint CAP-1206 (1206 (3216M) Capacitor)
pins: 1, 2

## TCC1206X7R181K102FT
designator C?  Capacitance: 180pF  (hidden comment: *)
Capacitor, Ceramic (MLCC), 180pF, ±10%, 1kV, X7R, ±10%, SMD 1206; Manufacturer: CCTC; Manufacturer Part Number: TCC1206X7R181K102FT; Package Size: 1206; JLCPCB Basic Part: No; JLCPCB Part Number: C282845; Supplier 1: LCSC; Category: Capacitors - MLCC; Supplier Part Number 1: C282845; Tolerance: ±10%; Voltage Rating: 1kV; Temperature Coefficient: X7R; RoHS: Yes; ComponentLink1Description: Datasheet; ComponentLink1URL: https://wmsc.lcsc.com/wmsc/upload/file/pdf/v2/lcsc/2304140030_CCTC-TCC1206X7R181K102FT_C282845.pdf; ComponentLink2Description: JLCPCB Part URL; ComponentLink2URL: https://jlcpcb.com/partdetail/C282845; ComponentLink3Description: LCSC Part URL; ComponentLink3URL: https://lcsc.com/product-detail/Multilayer-Ceramic-Capacitors-MLCC---SMD-SMT_CCTC-CCTC-TCC1206X7R181K102FT_C282845.html
footprint CAP-1206 (1206 (3216M) Capacitor)
pins: 1, 2

## TCC1206X7R181K500DT
designator C?  Capacitance: 180pF  (hidden comment: *)
Capacitor, Ceramic (MLCC), 180pF, ±10%, 50V, X7R, ±10%, SMD 1206; Manufacturer: CCTC; Manufacturer Part Number: TCC1206X7R181K500DT; Package Size: 1206; JLCPCB Basic Part: No; JLCPCB Part Number: C282846; Supplier 1: LCSC; Category: Capacitors - MLCC; Supplier Part Number 1: C282846; Tolerance: ±10%; Voltage Rating: 50V; Temperature Coefficient: X7R; RoHS: Yes; ComponentLink1Description: Datasheet; ComponentLink1URL: https://wmsc.lcsc.com/wmsc/upload/file/pdf/v2/lcsc/2304140030_CCTC-TCC1206X7R181K500DT_C282846.pdf; ComponentLink2Description: JLCPCB Part URL; ComponentLink2URL: https://jlcpcb.com/partdetail/C282846; ComponentLink3Description: LCSC Part URL; ComponentLink3URL: https://lcsc.com/product-detail/Multilayer-Ceramic-Capacitors-MLCC---SMD-SMT_CCTC-CCTC-TCC1206X7R181K500DT_C282846.html
footprint CAP-1206 (1206 (3216M) Capacitor)
pins: 1, 2

## TCC1206X7R202K102FT
designator C?  Capacitance: 2nF  (hidden comment: *)
Capacitor, Ceramic (MLCC), 2nF, ±10%, 1kV, X7R, ±10%, SMD 1206; Manufacturer: CCTC; Manufacturer Part Number: TCC1206X7R202K102FT; Package Size: 1206; JLCPCB Basic Part: No; JLCPCB Part Number: C5448963; Supplier 1: LCSC; Category: Capacitors - MLCC; Supplier Part Number 1: C5448963; Tolerance: ±10%; Voltage Rating: 1kV; Temperature Coefficient: X7R; RoHS: Yes; ComponentLink1Description: Datasheet; ComponentLink1URL: https://wmsc.lcsc.com/wmsc/upload/file/pdf/v2/lcsc/2403281713_CCTC-TCC1206X7R202K102FT_C5448963.pdf; ComponentLink2Description: JLCPCB Part URL; ComponentLink2URL: https://jlcpcb.com/partdetail/C5448963; ComponentLink3Description: LCSC Part URL; ComponentLink3URL: https://lcsc.com/product-detail/Multilayer-Ceramic-Capacitors-MLCC---SMD-SMT_CCTC-CCTC-TCC1206X7R202K102FT_C5448963.html
footprint CAP-1206 (1206 (3216M) Capacitor)
pins: 1, 2

## TCC1206X7R221K102DTS
designator C?  Capacitance: 220pF  (hidden comment: *)
Capacitor, Ceramic (MLCC), 220pF, ±10%, 1kV, X7R, ±10%, SMD 1206; Manufacturer: CCTC; Manufacturer Part Number: TCC1206X7R221K102DTS; Package Size: 1206; JLCPCB Basic Part: No; JLCPCB Part Number: C377073; Supplier 1: LCSC; Category: Capacitors - MLCC; Supplier Part Number 1: C377073; Tolerance: ±10%; Voltage Rating: 1kV; Temperature Coefficient: X7R; RoHS: Yes; ComponentLink1Description: Datasheet; ComponentLink1URL: https://wmsc.lcsc.com/wmsc/upload/file/pdf/v2/lcsc/2304140030_CCTC-TCC1206X7R221K102DTS_C377073.pdf; ComponentLink2Description: JLCPCB Part URL; ComponentLink2URL: https://jlcpcb.com/partdetail/C377073; ComponentLink3Description: LCSC Part URL; ComponentLink3URL: https://lcsc.com/product-detail/Multilayer-Ceramic-Capacitors-MLCC---SMD-SMT_CCTC-CCTC-TCC1206X7R221K102DTS_C377073.html
footprint CAP-1206 (1206 (3216M) Capacitor)
pins: 1, 2

## TCC1206X7R221K102FT
designator C?  Capacitance: 220pF  (hidden comment: *)
Capacitor, Ceramic (MLCC), 220pF, ±10%, 1kV, X7R, ±10%, SMD 1206; Manufacturer: CCTC; Manufacturer Part Number: TCC1206X7R221K102FT; Package Size: 1206; JLCPCB Basic Part: No; JLCPCB Part Number: C377074; Supplier 1: LCSC; Category: Capacitors - MLCC; Supplier Part Number 1: C377074; Tolerance: ±10%; Voltage Rating: 1kV; Temperature Coefficient: X7R; RoHS: Yes; ComponentLink1Description: Datasheet; ComponentLink1URL: https://wmsc.lcsc.com/wmsc/upload/file/pdf/v2/lcsc/2304140030_CCTC-TCC1206X7R221K102FT_C377074.pdf; ComponentLink2Description: JLCPCB Part URL; ComponentLink2URL: https://jlcpcb.com/partdetail/C377074; ComponentLink3Description: LCSC Part URL; ComponentLink3URL: https://lcsc.com/product-detail/Multilayer-Ceramic-Capacitors-MLCC---SMD-SMT_CCTC-CCTC-TCC1206X7R221K102FT_C377074.html
footprint CAP-1206 (1206 (3216M) Capacitor)
pins: 1, 2

## TCC1206X7R221K202FT
designator C?  Capacitance: 220pF  (hidden comment: *)
Capacitor, Ceramic (MLCC), 220pF, ±10%, 2kV, X7R, ±10%, SMD 1206; Manufacturer: CCTC; Manufacturer Part Number: TCC1206X7R221K202FT; Package Size: 1206; JLCPCB Basic Part: No; JLCPCB Part Number: C377075; Supplier 1: LCSC; Category: Capacitors - MLCC; Supplier Part Number 1: C377075; Tolerance: ±10%; Voltage Rating: 2kV; Temperature Coefficient: X7R; RoHS: Yes; ComponentLink1Description: Datasheet; ComponentLink1URL: https://wmsc.lcsc.com/wmsc/upload/file/pdf/v2/lcsc/2304140030_CCTC-TCC1206X7R221K202FT_C377075.pdf; ComponentLink2Description: JLCPCB Part URL; ComponentLink2URL: https://jlcpcb.com/partdetail/C377075; ComponentLink3Description: LCSC Part URL; ComponentLink3URL: https://lcsc.com/product-detail/Multilayer-Ceramic-Capacitors-MLCC---SMD-SMT_CCTC-CCTC-TCC1206X7R221K202FT_C377075.html
footprint CAP-1206 (1206 (3216M) Capacitor)
pins: 1, 2

## TCC1206X7R221K251DT
designator C?  Capacitance: 220pF  (hidden comment: *)
Capacitor, Ceramic (MLCC), 220pF, ±10%, 250V, X7R, ±10%, SMD 1206; Manufacturer: CCTC; Manufacturer Part Number: TCC1206X7R221K251DT; Package Size: 1206; JLCPCB Basic Part: No; JLCPCB Part Number: C377076; Supplier 1: LCSC; Category: Capacitors - MLCC; Supplier Part Number 1: C377076; Tolerance: ±10%; Voltage Rating: 250V; Temperature Coefficient: X7R; RoHS: Yes; ComponentLink1Description: Datasheet; ComponentLink1URL: https://wmsc.lcsc.com/wmsc/upload/file/pdf/v2/lcsc/2304140030_CCTC-TCC1206X7R221K251DT_C377076.pdf; ComponentLink2Description: JLCPCB Part URL; ComponentLink2URL: https://jlcpcb.com/partdetail/C377076; ComponentLink3Description: LCSC Part URL; ComponentLink3URL: https://lcsc.com/product-detail/Multilayer-Ceramic-Capacitors-MLCC---SMD-SMT_CCTC-CCTC-TCC1206X7R221K251DT_C377076.html
footprint CAP-1206 (1206 (3216M) Capacitor)
pins: 1, 2

## TCC1206X7R221K500DT
designator C?  Capacitance: 220pF  (hidden comment: *)
Capacitor, Ceramic (MLCC), 220pF, ±10%, 50V, X7R, ±10%, SMD 1206; Manufacturer: CCTC; Manufacturer Part Number: TCC1206X7R221K500DT; Package Size: 1206; JLCPCB Basic Part: No; JLCPCB Part Number: C377077; Supplier 1: LCSC; Category: Capacitors - MLCC; Supplier Part Number 1: C377077; Tolerance: ±10%; Voltage Rating: 50V; Temperature Coefficient: X7R; RoHS: Yes; ComponentLink1Description: Datasheet; ComponentLink1URL: https://wmsc.lcsc.com/wmsc/upload/file/pdf/v2/lcsc/2304140030_CCTC-TCC1206X7R221K500DT_C377077.pdf; ComponentLink2Description: JLCPCB Part URL; ComponentLink2URL: https://jlcpcb.com/partdetail/C377077; ComponentLink3Description: LCSC Part URL; ComponentLink3URL: https://lcsc.com/product-detail/Multilayer-Ceramic-Capacitors-MLCC---SMD-SMT_CCTC-CCTC-TCC1206X7R221K500DT_C377077.html
footprint CAP-1206 (1206 (3216M) Capacitor)
pins: 1, 2

## TCC1206X7R221K501FT
designator C?  Capacitance: 220pF  (hidden comment: *)
Capacitor, Ceramic (MLCC), 220pF, ±10%, 500V, X7R, ±10%, SMD 1206; Manufacturer: CCTC; Manufacturer Part Number: TCC1206X7R221K501FT; Package Size: 1206; JLCPCB Basic Part: No; JLCPCB Part Number: C377079; Supplier 1: LCSC; Category: Capacitors - MLCC; Supplier Part Number 1: C377079; Tolerance: ±10%; Voltage Rating: 500V; Temperature Coefficient: X7R; RoHS: Yes; ComponentLink1Description: Datasheet; ComponentLink1URL: https://wmsc.lcsc.com/wmsc/upload/file/pdf/v2/lcsc/2304140030_CCTC-TCC1206X7R221K501FT_C377079.pdf; ComponentLink2Description: JLCPCB Part URL; ComponentLink2URL: https://jlcpcb.com/partdetail/C377079; ComponentLink3Description: LCSC Part URL; ComponentLink3URL: https://lcsc.com/product-detail/Multilayer-Ceramic-Capacitors-MLCC---SMD-SMT_CCTC-CCTC-TCC1206X7R221K501FT_C377079.html
footprint CAP-1206 (1206 (3216M) Capacitor)
pins: 1, 2

## TCC1206X7R221M102DTS
designator C?  Capacitance: 220pF  (hidden comment: *)
Capacitor, Ceramic (MLCC), 220pF, ±20%, 1kV, X7R, ±20%, SMD 1206; Manufacturer: CCTC; Manufacturer Part Number: TCC1206X7R221M102DTS; Package Size: 1206; JLCPCB Basic Part: No; JLCPCB Part Number: C377080; Supplier 1: LCSC; Category: Capacitors - MLCC; Supplier Part Number 1: C377080; Tolerance: ±20%; Voltage Rating: 1kV; Temperature Coefficient: X7R; RoHS: Yes; ComponentLink1Description: Datasheet; ComponentLink1URL: https://wmsc.lcsc.com/wmsc/upload/file/pdf/v2/lcsc/2304140030_CCTC-TCC1206X7R221M102DTS_C377080.pdf; ComponentLink2Description: JLCPCB Part URL; ComponentLink2URL: https://jlcpcb.com/partdetail/C377080; ComponentLink3Description: LCSC Part URL; ComponentLink3URL: https://lcsc.com/product-detail/Multilayer-Ceramic-Capacitors-MLCC---SMD-SMT_CCTC-CCTC-TCC1206X7R221M102DTS_C377080.html
footprint CAP-1206 (1206 (3216M) Capacitor)
pins: 1, 2

## TCC1206X7R222K101DT
designator C?  Capacitance: 2.2nF  (hidden comment: *)
Capacitor, Ceramic (MLCC), 2.2nF, ±10%, 100V, X7R, ±10%, SMD 1206; Manufacturer: CCTC; Manufacturer Part Number: TCC1206X7R222K101DT; Package Size: 1206; JLCPCB Basic Part: No; JLCPCB Part Number: C377081; Supplier 1: LCSC; Category: Capacitors - MLCC; Supplier Part Number 1: C377081; Tolerance: ±10%; Voltage Rating: 100V; Temperature Coefficient: X7R; RoHS: Yes; ComponentLink1Description: Datasheet; ComponentLink1URL: https://wmsc.lcsc.com/wmsc/upload/file/pdf/v2/lcsc/2304140030_CCTC-TCC1206X7R222K101DT_C377081.pdf; ComponentLink2Description: JLCPCB Part URL; ComponentLink2URL: https://jlcpcb.com/partdetail/C377081; ComponentLink3Description: LCSC Part URL; ComponentLink3URL: https://lcsc.com/product-detail/Multilayer-Ceramic-Capacitors-MLCC---SMD-SMT_CCTC-CCTC-TCC1206X7R222K101DT_C377081.html
footprint CAP-1206 (1206 (3216M) Capacitor)
pins: 1, 2

## TCC1206X7R222K102DTS
designator C?  Capacitance: 2.2nF  (hidden comment: *)
Capacitor, Ceramic (MLCC), 2.2nF, ±10%, 1kV, X7R, ±10%, SMD 1206; Manufacturer: CCTC; Manufacturer Part Number: TCC1206X7R222K102DTS; Package Size: 1206; JLCPCB Basic Part: No; JLCPCB Part Number: C344193; Supplier 1: LCSC; Category: Capacitors - MLCC; Supplier Part Number 1: C344193; Tolerance: ±10%; Voltage Rating: 1kV; Temperature Coefficient: X7R; RoHS: Yes; ComponentLink1Description: Datasheet; ComponentLink1URL: https://wmsc.lcsc.com/wmsc/upload/file/pdf/v2/lcsc/2304140030_CCTC-TCC1206X7R222K102DTS_C344193.pdf; ComponentLink2Description: JLCPCB Part URL; ComponentLink2URL: https://jlcpcb.com/partdetail/C344193; ComponentLink3Description: LCSC Part URL; ComponentLink3URL: https://lcsc.com/product-detail/Multilayer-Ceramic-Capacitors-MLCC---SMD-SMT_CCTC-CCTC-TCC1206X7R222K102DTS_C344193.html
footprint CAP-1206 (1206 (3216M) Capacitor)
pins: 1, 2

## TCC1206X7R222K102FT
designator C?  Capacitance: 2.2nF  (hidden comment: *)
Capacitor, Ceramic (MLCC), 2.2nF, ±10%, 1kV, X7R, ±10%, SMD 1206; Manufacturer: CCTC; Manufacturer Part Number: TCC1206X7R222K102FT; Package Size: 1206; JLCPCB Basic Part: No; JLCPCB Part Number: C377082; Supplier 1: LCSC; Category: Capacitors - MLCC; Supplier Part Number 1: C377082; Tolerance: ±10%; Voltage Rating: 1kV; Temperature Coefficient: X7R; RoHS: Yes; ComponentLink1Description: Datasheet; ComponentLink1URL: https://wmsc.lcsc.com/wmsc/upload/file/pdf/v2/lcsc/2304140030_CCTC-TCC1206X7R222K102FT_C377082.pdf; ComponentLink2Description: JLCPCB Part URL; ComponentLink2URL: https://jlcpcb.com/partdetail/C377082; ComponentLink3Description: LCSC Part URL; ComponentLink3URL: https://lcsc.com/product-detail/Multilayer-Ceramic-Capacitors-MLCC---SMD-SMT_CCTC-CCTC-TCC1206X7R222K102FT_C377082.html
footprint CAP-1206 (1206 (3216M) Capacitor)
pins: 1, 2

## TCC1206X7R222K201DT
designator C?  Capacitance: 2.2nF  (hidden comment: *)
Capacitor, Ceramic (MLCC), 2.2nF, ±10%, 200V, X7R, ±10%, SMD 1206; Manufacturer: CCTC; Manufacturer Part Number: TCC1206X7R222K201DT; Package Size: 1206; JLCPCB Basic Part: No; JLCPCB Part Number: C377083; Supplier 1: LCSC; Category: Capacitors - MLCC; Supplier Part Number 1: C377083; Tolerance: ±10%; Voltage Rating: 200V; Temperature Coefficient: X7R; RoHS: Yes; ComponentLink1Description: Datasheet; ComponentLink1URL: https://wmsc.lcsc.com/wmsc/upload/file/pdf/v2/lcsc/2304140030_CCTC-TCC1206X7R222K201DT_C377083.pdf; ComponentLink2Description: JLCPCB Part URL; ComponentLink2URL: https://jlcpcb.com/partdetail/C377083; ComponentLink3Description: LCSC Part URL; ComponentLink3URL: https://lcsc.com/product-detail/Multilayer-Ceramic-Capacitors-MLCC---SMD-SMT_CCTC-CCTC-TCC1206X7R222K201DT_C377083.html
footprint CAP-1206 (1206 (3216M) Capacitor)
pins: 1, 2

## TCC1206X7R222K202HT
designator C?  Capacitance: 2.2nF  (hidden comment: *)
Capacitor, Ceramic (MLCC), 2.2nF, ±10%, 2kV, X7R, ±10%, SMD 1206; Manufacturer: CCTC; Manufacturer Part Number: TCC1206X7R222K202HT; Package Size: 1206; JLCPCB Basic Part: No; JLCPCB Part Number: C2992510; Supplier 1: LCSC; Category: Capacitors - MLCC; Supplier Part Number 1: C2992510; Tolerance: ±10%; Voltage Rating: 2kV; Temperature Coefficient: X7R; RoHS: Yes; ComponentLink1Description: Datasheet; ComponentLink1URL: https://wmsc.lcsc.com/wmsc/upload/file/pdf/v2/lcsc/2204121745_CCTC-TCC1206X7R222K202HT_C2992510.pdf; ComponentLink2Description: JLCPCB Part URL; ComponentLink2URL: https://jlcpcb.com/partdetail/C2992510; ComponentLink3Description: LCSC Part URL; ComponentLink3URL: https://lcsc.com/product-detail/Multilayer-Ceramic-Capacitors-MLCC---SMD-SMT_CCTC-CCTC-TCC1206X7R222K202HT_C2992510.html
footprint CAP-1206 (1206 (3216M) Capacitor)
pins: 1, 2